# Altium schematic symbol library jlcpcb_2025_04_capacitors_extended_0805.schlib: 3281 symbols (part 5 of 18) (continued)
## AS0805KKX7R0BB104
designator C?  Capacitance: 100nF  (hidden comment: *)
Capacitor, Ceramic (MLCC), 100nF, ±10%, 100V, X7R, ±10%, SMD 0805; Manufacturer: YAGEO; Manufacturer Part Number: AS0805KKX7R0BB104; Package Size: 0805; JLCPCB Basic Part: No; JLCPCB Part Number: C2174642; Supplier 1: LCSC; Category: Capacitors - MLCC; Supplier Part Number 1: C2174642; Tolerance: ±10%; Voltage Rating: 100V; Temperature Coefficient: X7R; RoHS: Yes; ComponentLink1Description: Datasheet; ComponentLink1URL: https://wmsc.lcsc.com/wmsc/upload/file/pdf/v2/lcsc/2202040700_YAGEO-AS0805KKX7R0BB104_C2174642.pdf; ComponentLink2Description: JLCPCB Part URL; ComponentLink2URL: https://jlcpcb.com/partdetail/C2174642; ComponentLink3Description: LCSC Part URL; ComponentLink3URL: https://lcsc.com/product-detail/Multilayer-Ceramic-Capacitors-MLCC---SMD-SMT_YAGEO-YAGEO-AS0805KKX7R0BB104_C2174642.html
footprint CAP-0805 (0805 (2012M) Capacitor)
pins: 1, 2

## AS0805KKX7R9BB104
designator C?  Capacitance: 100nF  (hidden comment: *)
Capacitor, Ceramic (MLCC), 100nF, ±10%, 50V, X7R, ±10%, SMD 0805; Manufacturer: YAGEO; Manufacturer Part Number: AS0805KKX7R9BB104; Package Size: 0805; JLCPCB Basic Part: No; JLCPCB Part Number: C2170896; Supplier 1: LCSC; Category: Capacitors - MLCC; Supplier Part Number 1: C2170896; Tolerance: ±10%; Voltage Rating: 50V; Temperature Coefficient: X7R; RoHS: Yes; ComponentLink1Description: Datasheet; ComponentLink1URL: https://wmsc.lcsc.com/wmsc/upload/file/pdf/v2/lcsc/2202040500_YAGEO-AS0805KKX7R9BB104_C2170896.pdf; ComponentLink2Description: JLCPCB Part URL; ComponentLink2URL: https://jlcpcb.com/partdetail/C2170896; ComponentLink3Description: LCSC Part URL; ComponentLink3URL: https://lcsc.com/product-detail/Multilayer-Ceramic-Capacitors-MLCC---SMD-SMT_YAGEO-YAGEO-AS0805KKX7R9BB104_C2170896.html
footprint CAP-0805 (0805 (2012M) Capacitor)
pins: 1, 2

## AS0805KRX7R0BB103
designator C?  Capacitance: 10nF  (hidden comment: *)
Capacitor, Ceramic (MLCC), 10nF, ±10%, 100V, X7R, ±10%, SMD 0805; Manufacturer: YAGEO; Manufacturer Part Number: AS0805KRX7R0BB103; Package Size: 0805; JLCPCB Basic Part: No; JLCPCB Part Number: C2174497; Supplier 1: LCSC; Category: Capacitors - MLCC; Supplier Part Number 1: C2174497; Tolerance: ±10%; Voltage Rating: 100V; Temperature Coefficient: X7R; RoHS: Yes; ComponentLink1Description: Datasheet; ComponentLink1URL: https://wmsc.lcsc.com/wmsc/upload/file/pdf/v2/lcsc/2202040700_YAGEO-AS0805KRX7R0BB103_C2174497.pdf; ComponentLink2Description: JLCPCB Part URL; ComponentLink2URL: https://jlcpcb.com/partdetail/C2174497; ComponentLink3Description: LCSC Part URL; ComponentLink3URL: https://lcsc.com/product-detail/Multilayer-Ceramic-Capacitors-MLCC---SMD-SMT_YAGEO-YAGEO-AS0805KRX7R0BB103_C2174497.html
footprint CAP-0805 (0805 (2012M) Capacitor)
pins: 1, 2

## AS0805KRX7R0BB223
designator C?  Capacitance: 22nF  (hidden comment: *)
Capacitor, Ceramic (MLCC), 22nF, ±10%, 100V, X7R, ±10%, SMD 0805; Manufacturer: YAGEO; Manufacturer Part Number: AS0805KRX7R0BB223; Package Size: 0805; JLCPCB Basic Part: No; JLCPCB Part Number: C2178183; Supplier 1: LCSC; Category: Capacitors - MLCC; Supplier Part Number 1: C2178183; Tolerance: ±10%; Voltage Rating: 100V; Temperature Coefficient: X7R; RoHS: Yes; ComponentLink1Description: Datasheet; ComponentLink1URL: https://wmsc.lcsc.com/wmsc/upload/file/pdf/v2/lcsc/2202040930_YAGEO-AS0805KRX7R0BB223_C2178183.pdf; ComponentLink2Description: JLCPCB Part URL; ComponentLink2URL: https://jlcpcb.com/partdetail/C2178183; ComponentLink3Description: LCSC Part URL; ComponentLink3URL: https://lcsc.com/product-detail/Multilayer-Ceramic-Capacitors-MLCC---SMD-SMT_YAGEO-YAGEO-AS0805KRX7R0BB223_C2178183.html
footprint CAP-0805 (0805 (2012M) Capacitor)
pins: 1, 2

## C0805B104K500NT
designator C?  Capacitance: 100nF  (hidden comment: *)
Capacitor, Ceramic (MLCC), 100nF, ±10%, 50V, X7R, ±10%, SMD 0805; Manufacturer: TORCH; Manufacturer Part Number: C0805B104K500NT; Package Size: 0805; JLCPCB Basic Part: No; JLCPCB Part Number: C476766; Supplier 1: LCSC; Category: Capacitors - MLCC; Supplier Part Number 1: C476766; Tolerance: ±10%; Voltage Rating: 50V; Temperature Coefficient: X7R; RoHS: Yes; ComponentLink1Description: Datasheet; ComponentLink1URL: https://wmsc.lcsc.com/wmsc/upload/file/pdf/v2/lcsc/1912300933_TORCH-C0805B104K500NT_C476766.pdf; ComponentLink2Description: JLCPCB Part URL; ComponentLink2URL: https://jlcpcb.com/partdetail/C476766; ComponentLink3Description: LCSC Part URL; ComponentLink3URL: https://lcsc.com/product-detail/Multilayer-Ceramic-Capacitors-MLCC---SMD-SMT_TORCH-TORCH-C0805B104K500NT_C476766.html
footprint CAP-0805 (0805 (2012M) Capacitor)
pins: 1, 2

## C0805B104M500NT
designator C?  Capacitance: 100nF  (hidden comment: *)
Capacitor, Ceramic (MLCC), 100nF, ±20%, 50V, X7R, ±20%, SMD 0805; Manufacturer: TORCH; Manufacturer Part Number: C0805B104M500NT; Package Size: 0805; JLCPCB Basic Part: No; JLCPCB Part Number: C515949; Supplier 1: LCSC; Category: Capacitors - MLCC; Supplier Part Number 1: C515949; Tolerance: ±20%; Voltage Rating: 50V; Temperature Coefficient: X7R; RoHS: Yes; ComponentLink1Description: Datasheet; ComponentLink1URL: https://wmsc.lcsc.com/wmsc/upload/file/pdf/v2/lcsc/2004231732_TORCH-C0805B104M500NT_C515949.pdf; ComponentLink2Description: JLCPCB Part URL; ComponentLink2URL: https://jlcpcb.com/partdetail/C515949; ComponentLink3Description: LCSC Part URL; ComponentLink3URL: https://lcsc.com/product-detail/Multilayer-Ceramic-Capacitors-MLCC---SMD-SMT_TORCH-TORCH-C0805B104M500NT_C515949.html
footprint CAP-0805 (0805 (2012M) Capacitor)
pins: 1, 2

## C0805B106K016T
designator C?  Capacitance: 10uF  (hidden comment: *)
Capacitor, Ceramic (MLCC), 10uF, ±10%, 16V, X5R, ±10%, SMD 0805; Manufacturer: IHHEC(HOLY STONE ENTERPRISE CO., LTD); Manufacturer Part Number: C0805B106K016T; Package Size: 0805; JLCPCB Basic Part: No; JLCPCB Part Number: C961509; Supplier 1: LCSC; Category: Capacitors - MLCC; Supplier Part Number 1: C961509; Tolerance: ±10%; Voltage Rating: 16V; Temperature Coefficient: X5R; RoHS: Yes; ComponentLink1Description: Datasheet; ComponentLink1URL: https://wmsc.lcsc.com/wmsc/upload/file/pdf/v2/lcsc/2304140030_IHHEC-HOLY-STONE-ENTERPRISE-CO---LTD-C0805B106K016T_C961509.pdf; ComponentLink2Description: JLCPCB Part URL; ComponentLink2URL: https://jlcpcb.com/partdetail/C961509; ComponentLink3Description: LCSC Part URL; ComponentLink3URL: https://lcsc.com/product-detail/Multilayer-Ceramic-Capacitors-MLCC---SMD-SMT_IHHECHOLY-STONE-ENTERPRISE-CO.%2C-LTD-IHHECHOLY-STONE-ENTERPRISE-CO.%2C-LTD-C0805B106K016T_C961509.html
footprint CAP-0805 (0805 (2012M) Capacitor)
pins: 1, 2

## C0805B106K025T
designator C?  Capacitance: 10uF  (hidden comment: *)
Capacitor, Ceramic (MLCC), 10uF, ±10%, 25V, X5R, ±10%, SMD 0805; Manufacturer: IHHEC(HOLY STONE ENTERPRISE CO., LTD); Manufacturer Part Number: C0805B106K025T; Package Size: 0805; JLCPCB Basic Part: No; JLCPCB Part Number: C172703; Supplier 1: LCSC; Category: Capacitors - MLCC; Supplier Part Number 1: C172703; Tolerance: ±10%; Voltage Rating: 25V; Temperature Coefficient: X5R; RoHS: Yes; ComponentLink1Description: Datasheet; ComponentLink1URL: https://wmsc.lcsc.com/wmsc/upload/file/pdf/v2/lcsc/1811132022_IHHEC-HOLY-STONE-ENTERPRISE-CO---LTD-C0805B106K025T_C172703.pdf; ComponentLink2Description: JLCPCB Part URL; ComponentLink2URL: https://jlcpcb.com/partdetail/C172703; ComponentLink3Description: LCSC Part URL; ComponentLink3URL: https://lcsc.com/product-detail/Multilayer-Ceramic-Capacitors-MLCC---SMD-SMT_IHHECHOLY-STONE-ENTERPRISE-CO.%2C-LTD-IHHECHOLY-STONE-ENTERPRISE-CO.%2C-LTD-C0805B106K025T_C172703.html
footprint CAP-0805 (0805 (2012M) Capacitor)
pins: 1, 2

## C0805B475K050T
designator C?  Capacitance: 4.7uF  (hidden comment: *)
Capacitor, Ceramic (MLCC), 4.7uF, ±10%, 50V, X5R, ±10%, SMD 0805; Manufacturer: IHHEC(HOLY STONE ENTERPRISE CO., LTD); Manufacturer Part Number: C0805B475K050T; Package Size: 0805; JLCPCB Basic Part: No; JLCPCB Part Number: C105911; Supplier 1: LCSC; Category: Capacitors - MLCC; Supplier Part Number 1: C105911; Tolerance: ±10%; Voltage Rating: 50V; Temperature Coefficient: X5R; RoHS: Yes; ComponentLink1Description: Datasheet; ComponentLink1URL: https://wmsc.lcsc.com/wmsc/upload/file/pdf/v2/lcsc/1809281514_IHHEC-HOLY-STONE-ENTERPRISE-CO---LTD-C0805B475K050T_C105911.pdf; ComponentLink2Description: JLCPCB Part URL; ComponentLink2URL: https://jlcpcb.com/partdetail/C105911; ComponentLink3Description: LCSC Part URL; ComponentLink3URL: https://lcsc.com/product-detail/Multilayer-Ceramic-Capacitors-MLCC---SMD-SMT_IHHECHOLY-STONE-ENTERPRISE-CO.%2C-LTD-IHHECHOLY-STONE-ENTERPRISE-CO.%2C-LTD-C0805B475K050T_C105911.html
footprint CAP-0805 (0805 (2012M) Capacitor)
pins: 1, 2

## C0805C100J5RACAUTO
designator C?  Capacitance: 10pF  (hidden comment: *)
Capacitor, Ceramic (MLCC), 10pF, ±5%, 50V, X7R, ±5%, SMD 0805; Manufacturer: KEMET; Manufacturer Part Number: C0805C100J5RACAUTO; Package Size: 0805; JLCPCB Basic Part: No; JLCPCB Part Number: C129632; Supplier 1: LCSC; Category: Capacitors - MLCC; Supplier Part Number 1: C129632; Tolerance: ±5%; Voltage Rating: 50V; Temperature Coefficient: X7R; RoHS: Yes; ComponentLink1Description: Datasheet; ComponentLink1URL: https://wmsc.lcsc.com/wmsc/upload/file/pdf/v2/lcsc/2304140030_KEMET-C0805C100J5RACAUTO_C129632.pdf; ComponentLink2Description: JLCPCB Part URL; ComponentLink2URL: https://jlcpcb.com/partdetail/C129632; ComponentLink3Description: LCSC Part URL; ComponentLink3URL: https://lcsc.com/product-detail/Multilayer-Ceramic-Capacitors-MLCC---SMD-SMT_KEMET-KEMET-C0805C100J5RACAUTO_C129632.html
footprint CAP-0805 (0805 (2012M) Capacitor)
pins: 1, 2

## C0805C101K5GAC7800
designator C?  Capacitance: 100pF  (hidden comment: *)
Capacitor, Ceramic (MLCC), 100pF, ±10%, 50V, C0G, ±10%, SMD 0805; Manufacturer: KEMET; Manufacturer Part Number: C0805C101K5GAC7800; Package Size: 0805; JLCPCB Basic Part: No; JLCPCB Part Number: C599829; Supplier 1: LCSC; Category: Capacitors - MLCC; Supplier Part Number 1: C599829; Tolerance: ±10%; Voltage Rating: 50V; Temperature Coefficient: C0G; RoHS: Yes; ComponentLink1Description: Datasheet; ComponentLink1URL: https://wmsc.lcsc.com/wmsc/upload/file/pdf/v2/lcsc/2006181211_KEMET-C0805C101K5GAC7800_C599829.pdf; ComponentLink2Description: JLCPCB Part URL; ComponentLink2URL: https://jlcpcb.com/partdetail/C599829; ComponentLink3Description: LCSC Part URL; ComponentLink3URL: https://lcsc.com/product-detail/Multilayer-Ceramic-Capacitors-MLCC---SMD-SMT_KEMET-KEMET-C0805C101K5GAC7800_C599829.html
footprint CAP-0805 (0805 (2012M) Capacitor)
pins: 1, 2

## C0805C101K5RACAUTO
designator C?  Capacitance: 100pF  (hidden comment: *)
Capacitor, Ceramic (MLCC), 100pF, ±10%, 50V, X7R, ±10%, SMD 0805; Manufacturer: KEMET; Manufacturer Part Number: C0805C101K5RACAUTO; Package Size: 0805; JLCPCB Basic Part: No; JLCPCB Part Number: C1864745; Supplier 1: LCSC; Category: Capacitors - MLCC; Supplier Part Number 1: C1864745; Tolerance: ±10%; Voltage Rating: 50V; Temperature Coefficient: X7R; RoHS: Yes; ComponentLink1Description: Datasheet; ComponentLink1URL: https://wmsc.lcsc.com/wmsc/upload/file/pdf/v2/lcsc/2304140030_KEMET-C0805C101K5RACAUTO_C1864745.pdf; ComponentLink2Description: JLCPCB Part URL; ComponentLink2URL: https://jlcpcb.com/partdetail/C1864745; ComponentLink3Description: LCSC Part URL; ComponentLink3URL: https://lcsc.com/product-detail/Multilayer-Ceramic-Capacitors-MLCC---SMD-SMT_KEMET-KEMET-C0805C101K5RACAUTO_C1864745.html
footprint CAP-0805 (0805 (2012M) Capacitor)
pins: 1, 2

## C0805C102J1RACAUTO
designator C?  Capacitance: 1nF  (hidden comment: *)
Capacitor, Ceramic (MLCC), 1nF, ±5%, 100V, X7R, ±5%, SMD 0805; Manufacturer: KEMET; Manufacturer Part Number: C0805C102J1RACAUTO; Package Size: 0805; JLCPCB Basic Part: No; JLCPCB Part Number: C129634; Supplier 1: LCSC; Category: Capacitors - MLCC; Supplier Part Number 1: C129634; Tolerance: ±5%; Voltage Rating: 100V; Temperature Coefficient: X7R; RoHS: Yes; ComponentLink1Description: Datasheet; ComponentLink1URL: https://wmsc.lcsc.com/wmsc/upload/file/pdf/v2/lcsc/2304140030_KEMET-C0805C102J1RACAUTO_C129634.pdf; ComponentLink2Description: JLCPCB Part URL; ComponentLink2URL: https://jlcpcb.com/partdetail/C129634; ComponentLink3Description: LCSC Part URL; ComponentLink3URL: https://lcsc.com/product-detail/Multilayer-Ceramic-Capacitors-MLCC---SMD-SMT_KEMET-KEMET-C0805C102J1RACAUTO_C129634.html
footprint CAP-0805 (0805 (2012M) Capacitor)
pins: 1, 2

## C0805C102J2GAC7800
designator C?  Capacitance: 1nF  (hidden comment: *)
Capacitor, Ceramic (MLCC), 1nF, ±5%, 200V, C0G, ±5%, SMD 0805; Manufacturer: KEMET; Manufacturer Part Number: C0805C102J2GAC7800; Package Size: 0805; JLCPCB Basic Part: No; JLCPCB Part Number: C2170811; Supplier 1: LCSC; Category: Capacitors - MLCC; Supplier Part Number 1: C2170811; Tolerance: ±5%; Voltage Rating: 200V; Temperature Coefficient: C0G; RoHS: Yes; ComponentLink1Description: Datasheet; ComponentLink1URL: https://wmsc.lcsc.com/wmsc/upload/file/pdf/v2/lcsc/2304140030_KEMET-C0805C102J2GAC7800_C2170811.pdf; ComponentLink2Description: JLCPCB Part URL; ComponentLink2URL: https://jlcpcb.com/partdetail/C2170811; ComponentLink3Description: LCSC Part URL; ComponentLink3URL: https://lcsc.com/product-detail/Multilayer-Ceramic-Capacitors-MLCC---SMD-SMT_KEMET-KEMET-C0805C102J2GAC7800_C2170811.html
footprint CAP-0805 (0805 (2012M) Capacitor)
pins: 1, 2

## C0805C102J5GACAUTO
designator C?  Capacitance: 1nF  (hidden comment: *)
Capacitor, Ceramic (MLCC), 1nF, ±5%, 50V, C0G, ±5%, SMD 0805; Manufacturer: KEMET; Manufacturer Part Number: C0805C102J5GACAUTO; Package Size: 0805; JLCPCB Basic Part: No; JLCPCB Part Number: C129635; Supplier 1: LCSC; Category: Capacitors - MLCC; Supplier Part Number 1: C129635; Tolerance: ±5%; Voltage Rating: 50V; Temperature Coefficient: C0G; RoHS: Yes; ComponentLink1Description: Datasheet; ComponentLink1URL: https://wmsc.lcsc.com/wmsc/upload/file/pdf/v2/lcsc/2304140030_KEMET-C0805C102J5GACAUTO_C129635.pdf; ComponentLink2Description: JLCPCB Part URL; ComponentLink2URL: https://jlcpcb.com/partdetail/C129635; ComponentLink3Description: LCSC Part URL; ComponentLink3URL: https://lcsc.com/product-detail/Multilayer-Ceramic-Capacitors-MLCC---SMD-SMT_KEMET-KEMET-C0805C102J5GACAUTO_C129635.html
footprint CAP-0805 (0805 (2012M) Capacitor)
pins: 1, 2

## C0805C102J5RACAUTO
designator C?  Capacitance: 1nF  (hidden comment: *)
Capacitor, Ceramic (MLCC), 1nF, ±5%, 50V, X7R, ±5%, SMD 0805; Manufacturer: KEMET; Manufacturer Part Number: C0805C102J5RACAUTO; Package Size: 0805; JLCPCB Basic Part: No; JLCPCB Part Number: C129636; Supplier 1: LCSC; Category: Capacitors - MLCC; Supplier Part Number 1: C129636; Tolerance: ±5%; Voltage Rating: 50V; Temperature Coefficient: X7R; RoHS: Yes; ComponentLink1Description: Datasheet; ComponentLink1URL: https://wmsc.lcsc.com/wmsc/upload/file/pdf/v2/lcsc/2304140030_KEMET-C0805C102J5RACAUTO_C129636.pdf; ComponentLink2Description: JLCPCB Part URL; ComponentLink2URL: https://jlcpcb.com/partdetail/C129636; ComponentLink3Description: LCSC Part URL; ComponentLink3URL: https://lcsc.com/product-detail/Multilayer-Ceramic-Capacitors-MLCC---SMD-SMT_KEMET-KEMET-C0805C102J5RACAUTO_C129636.html
footprint CAP-0805 (0805 (2012M) Capacitor)
pins: 1, 2

## C0805C102K1RACAUTO
designator C?  Capacitance: 1nF  (hidden comment: *)
Capacitor, Ceramic (MLCC), 1nF, ±10%, 100V, X7R, ±10%, SMD 0805; Manufacturer: KEMET; Manufacturer Part Number: C0805C102K1RACAUTO; Package Size: 0805; JLCPCB Basic Part: No; JLCPCB Part Number: C2171782; Supplier 1: LCSC; Category: Capacitors - MLCC; Supplier Part Number 1: C2171782; Tolerance: ±10%; Voltage Rating: 100V; Temperature Coefficient: X7R; RoHS: Yes; ComponentLink1Description: Datasheet; ComponentLink1URL: https://wmsc.lcsc.com/wmsc/upload/file/pdf/v2/lcsc/2304140030_KEMET-C0805C102K1RACAUTO_C2171782.pdf; ComponentLink2Description: JLCPCB Part URL; ComponentLink2URL: https://jlcpcb.com/partdetail/C2171782; ComponentLink3Description: LCSC Part URL; ComponentLink3URL: https://lcsc.com/product-detail/Multilayer-Ceramic-Capacitors-MLCC---SMD-SMT_KEMET-KEMET-C0805C102K1RACAUTO_C2171782.html
footprint CAP-0805 (0805 (2012M) Capacitor)
pins: 1, 2

## C0805C102KARACAUTO
designator C?  Capacitance: 1nF  (hidden comment: *)
Capacitor, Ceramic (MLCC), 1nF, ±10%, 250V, X7R, ±10%, SMD 0805; Manufacturer: KEMET; Manufacturer Part Number: C0805C102KARACAUTO; Package Size: 0805; JLCPCB Basic Part: No; JLCPCB Part Number: C129637; Supplier 1: LCSC; Category: Capacitors - MLCC; Supplier Part Number 1: C129637; Tolerance: ±10%; Voltage Rating: 250V; Temperature Coefficient: X7R; RoHS: Yes; ComponentLink1Description: Datasheet; ComponentLink1URL: https://wmsc.lcsc.com/wmsc/upload/file/pdf/v2/lcsc/2304140030_KEMET-C0805C102KARACAUTO_C129637.pdf; ComponentLink2Description: JLCPCB Part URL; ComponentLink2URL: https://jlcpcb.com/partdetail/C129637; ComponentLink3Description: LCSC Part URL; ComponentLink3URL: https://lcsc.com/product-detail/Multilayer-Ceramic-Capacitors-MLCC---SMD-SMT_KEMET-KEMET-C0805C102KARACAUTO_C129637.html
footprint CAP-0805 (0805 (2012M) Capacitor)
pins: 1, 2

## C0805C103K1RACAUTO
designator C?  Capacitance: 10nF  (hidden comment: *)
Capacitor, Ceramic (MLCC), 10nF, ±10%, 100V, X7R, ±10%, SMD 0805; Manufacturer: KEMET; Manufacturer Part Number: C0805C103K1RACAUTO; Package Size: 0805; JLCPCB Basic Part: No; JLCPCB Part Number: C561833; Supplier 1: LCSC; Category: Capacitors - MLCC; Supplier Part Number 1: C561833; Tolerance: ±10%; Voltage Rating: 100V; Temperature Coefficient: X7R; RoHS: Yes; ComponentLink1Description: Datasheet; ComponentLink1URL: https://wmsc.lcsc.com/wmsc/upload/file/pdf/v2/lcsc/2304140030_KEMET-C0805C103K1RACAUTO_C561833.pdf; ComponentLink2Description: JLCPCB Part URL; ComponentLink2URL: https://jlcpcb.com/partdetail/C561833; ComponentLink3Description: LCSC Part URL; ComponentLink3URL: https://lcsc.com/product-detail/Multilayer-Ceramic-Capacitors-MLCC---SMD-SMT_KEMET-KEMET-C0805C103K1RACAUTO_C561833.html
footprint CAP-0805 (0805 (2012M) Capacitor)
pins: 1, 2

## C0805C103KARACAUTO
designator C?  Capacitance: 10nF  (hidden comment: *)
Capacitor, Ceramic (MLCC), 10nF, ±10%, 250V, X7R, ±10%, SMD 0805; Manufacturer: KEMET; Manufacturer Part Number: C0805C103KARACAUTO; Package Size: 0805; JLCPCB Basic Part: No; JLCPCB Part Number: C129640; Supplier 1: LCSC; Category: Capacitors - MLCC; Supplier Part Number 1: C129640; Tolerance: ±10%; Voltage Rating: 250V; Temperature Coefficient: X7R; RoHS: Yes; ComponentLink1Description: Datasheet; ComponentLink1URL: https://wmsc.lcsc.com/wmsc/upload/file/pdf/v2/lcsc/2304140030_KEMET-C0805C103KARACAUTO_C129640.pdf; ComponentLink2Description: JLCPCB Part URL; ComponentLink2URL: https://jlcpcb.com/partdetail/C129640; ComponentLink3Description: LCSC Part URL; ComponentLink3URL: https://lcsc.com/product-detail/Multilayer-Ceramic-Capacitors-MLCC---SMD-SMT_KEMET-KEMET-C0805C103KARACAUTO_C129640.html
footprint CAP-0805 (0805 (2012M) Capacitor)
pins: 1, 2

## C0805C104J5RAC7800
designator C?  Capacitance: 100nF  (hidden comment: *)
Capacitor, Ceramic (MLCC), 100nF, ±5%, 50V, X7R, ±5%, SMD 0805; Manufacturer: KEMET; Manufacturer Part Number: C0805C104J5RAC7800; Package Size: 0805; JLCPCB Basic Part: No; JLCPCB Part Number: C599848; Supplier 1: LCSC; Category: Capacitors - MLCC; Supplier Part Number 1: C599848; Tolerance: ±5%; Voltage Rating: 50V; Temperature Coefficient: X7R; RoHS: Yes; ComponentLink1Description: Datasheet; ComponentLink1URL: https://wmsc.lcsc.com/wmsc/upload/file/pdf/v2/lcsc/2304140030_KEMET-C0805C104J5RAC7800_C599848.pdf; ComponentLink2Description: JLCPCB Part URL; ComponentLink2URL: https://jlcpcb.com/partdetail/C599848; ComponentLink3Description: LCSC Part URL; ComponentLink3URL: https://lcsc.com/product-detail/Multilayer-Ceramic-Capacitors-MLCC---SMD-SMT_KEMET-KEMET-C0805C104J5RAC7800_C599848.html
footprint CAP-0805 (0805 (2012M) Capacitor)
pins: 1, 2

## C0805C104J5RACAUTO
designator C?  Capacitance: 100nF  (hidden comment: *)
Capacitor, Ceramic (MLCC), 100nF, ±5%, 50V, X7R, ±5%, SMD 0805; Manufacturer: KEMET; Manufacturer Part Number: C0805C104J5RACAUTO; Package Size: 0805; JLCPCB Basic Part: No; JLCPCB Part Number: C696366; Supplier 1: LCSC; Category: Capacitors - MLCC; Supplier Part Number 1: C696366; Tolerance: ±5%; Voltage Rating: 50V; Temperature Coefficient: X7R; RoHS: Yes; ComponentLink1Description: Datasheet; ComponentLink1URL: https://wmsc.lcsc.com/wmsc/upload/file/pdf/v2/lcsc/2304140030_KEMET-C0805C104J5RACAUTO_C696366.pdf; ComponentLink2Description: JLCPCB Part URL; ComponentLink2URL: https://jlcpcb.com/partdetail/C696366; ComponentLink3Description: LCSC Part URL; ComponentLink3URL: https://lcsc.com/product-detail/Multilayer-Ceramic-Capacitors-MLCC---SMD-SMT_KEMET-KEMET-C0805C104J5RACAUTO_C696366.html
footprint CAP-0805 (0805 (2012M) Capacitor)
pins: 1, 2

## C0805C104K1RACAUTO
designator C?  Capacitance: 100nF  (hidden comment: *)
Capacitor, Ceramic (MLCC), 100nF, ±10%, 100V, X7R, ±10%, SMD 0805; Manufacturer: KEMET; Manufacturer Part Number: C0805C104K1RACAUTO; Package Size: 0805; JLCPCB Basic Part: No; JLCPCB Part Number: C141125; Supplier 1: LCSC; Category: Capacitors - MLCC; Supplier Part Number 1: C141125; Tolerance: ±10%; Voltage Rating: 100V; Temperature Coefficient: X7R; RoHS: Yes; ComponentLink1Description: Datasheet; ComponentLink1URL: https://wmsc.lcsc.com/wmsc/upload/file/pdf/v2/lcsc/2304140030_KEMET-C0805C104K1RACAUTO_C141125.pdf; ComponentLink2Description: JLCPCB Part URL; ComponentLink2URL: https://jlcpcb.com/partdetail/C141125; ComponentLink3Description: LCSC Part URL; ComponentLink3URL: https://lcsc.com/product-detail/Multilayer-Ceramic-Capacitors-MLCC---SMD-SMT_KEMET-KEMET-C0805C104K1RACAUTO_C141125.html
footprint CAP-0805 (0805 (2012M) Capacitor)
pins: 1, 2

## C0805C104K1RACTU
designator C?  Capacitance: 100nF  (hidden comment: *)
Capacitor, Ceramic (MLCC), 100nF, ±10%, 100V, X7R, ±10%, SMD 0805; Manufacturer: KEMET; Manufacturer Part Number: C0805C104K1RACTU; Package Size: 0805; JLCPCB Basic Part: No; JLCPCB Part Number: C3151888; Supplier 1: LCSC; Category: Capacitors - MLCC; Supplier Part Number 1: C3151888; Tolerance: ±10%; Voltage Rating: 100V; Temperature Coefficient: X7R; RoHS: Yes; ComponentLink1Description: Datasheet; ComponentLink1URL: https://wmsc.lcsc.com/wmsc/upload/file/pdf/v2/lcsc/2206282015_KEMET-C0805C104K1RACTU_C3151888.pdf; ComponentLink2Description: JLCPCB Part URL; ComponentLink2URL: https://jlcpcb.com/partdetail/C3151888; ComponentLink3Description: LCSC Part URL; ComponentLink3URL: https://lcsc.com/product-detail/Multilayer-Ceramic-Capacitors-MLCC---SMD-SMT_KEMET-KEMET-C0805C104K1RACTU_C3151888.html
footprint CAP-0805 (0805 (2012M) Capacitor)
pins: 1, 2

## C0805C104K1RECAUTO
designator C?  Capacitance: 100nF  (hidden comment: *)
Capacitor, Ceramic (MLCC), 100nF, ±10%, 100V, X7R, ±10%, SMD 0805; Manufacturer: KEMET; Manufacturer Part Number: C0805C104K1RECAUTO; Package Size: 0805; JLCPCB Basic Part: No; JLCPCB Part Number: C696367; Supplier 1: LCSC; Category: Capacitors - MLCC; Supplier Part Number 1: C696367; Tolerance: ±10%; Voltage Rating: 100V; Temperature Coefficient: X7R; RoHS: Yes; ComponentLink1Description: Datasheet; ComponentLink1URL: https://wmsc.lcsc.com/wmsc/upload/file/pdf/v2/lcsc/2304140030_KEMET-C0805C104K1RECAUTO_C696367.pdf; ComponentLink2Description: JLCPCB Part URL; ComponentLink2URL: https://jlcpcb.com/partdetail/C696367; ComponentLink3Description: LCSC Part URL; ComponentLink3URL: https://lcsc.com/product-detail/Multilayer-Ceramic-Capacitors-MLCC---SMD-SMT_KEMET-KEMET-C0805C104K1RECAUTO_C696367.html
footprint CAP-0805 (0805 (2012M) Capacitor)
pins: 1, 2

## C0805C104K3RACTU
designator C?  Capacitance: 100nF  (hidden comment: *)
Capacitor, Ceramic (MLCC), 100nF, ±10%, 25V, X7R, ±10%, SMD 0805; Manufacturer: KEMET; Manufacturer Part Number: C0805C104K3RACTU; Package Size: 0805; JLCPCB Basic Part: No; JLCPCB Part Number: C2167212; Supplier 1: LCSC; Category: Capacitors - MLCC; Supplier Part Number 1: C2167212; Tolerance: ±10%; Voltage Rating: 25V; Temperature Coefficient: X7R; RoHS: Yes; ComponentLink1Description: Datasheet; ComponentLink1URL: https://wmsc.lcsc.com/wmsc/upload/file/pdf/v2/lcsc/2304140030_KEMET-C0805C104K3RACTU_C2167212.pdf; ComponentLink2Description: JLCPCB Part URL; ComponentLink2URL: https://jlcpcb.com/partdetail/C2167212; ComponentLink3Description: LCSC Part URL; ComponentLink3URL: https://lcsc.com/product-detail/Multilayer-Ceramic-Capacitors-MLCC---SMD-SMT_KEMET-KEMET-C0805C104K3RACTU_C2167212.html
footprint CAP-0805 (0805 (2012M) Capacitor)
pins: 1, 2

## C0805C104K5RAC7800
designator C?  Capacitance: 100nF  (hidden comment: *)
Capacitor, Ceramic (MLCC), 100nF, ±10%, 50V, X7R, ±10%, SMD 0805; Manufacturer: KEMET; Manufacturer Part Number: C0805C104K5RAC7800; Package Size: 0805; JLCPCB Basic Part: No; JLCPCB Part Number: C75414; Supplier 1: LCSC; Category: Capacitors - MLCC; Supplier Part Number 1: C75414; Tolerance: ±10%; Voltage Rating: 50V; Temperature Coefficient: X7R; RoHS: Yes; ComponentLink1Description: Datasheet; ComponentLink1URL: https://wmsc.lcsc.com/wmsc/upload/file/pdf/v2/lcsc/2304140030_KEMET-C0805C104K5RAC7800_C75414.pdf; ComponentLink2Description: JLCPCB Part URL; ComponentLink2URL: https://jlcpcb.com/partdetail/C75414; ComponentLink3Description: LCSC Part URL; ComponentLink3URL: https://lcsc.com/product-detail/Multilayer-Ceramic-Capacitors-MLCC---SMD-SMT_KEMET-KEMET-C0805C104K5RAC7800_C75414.html
footprint CAP-0805 (0805 (2012M) Capacitor)
pins: 1, 2